# Altium footprint library MIC.PcbLib: 1 footprints
Each footprint in its own frame and in the unit in brackets; x right, y up, seen from the top. Pads: shape width x height; smd on the part's side, far side on the other; paste and mask are expansions set on the pad; w line width, h text height; cw(c..) or ccw(c..) is an arc to the next point about the centre after c.
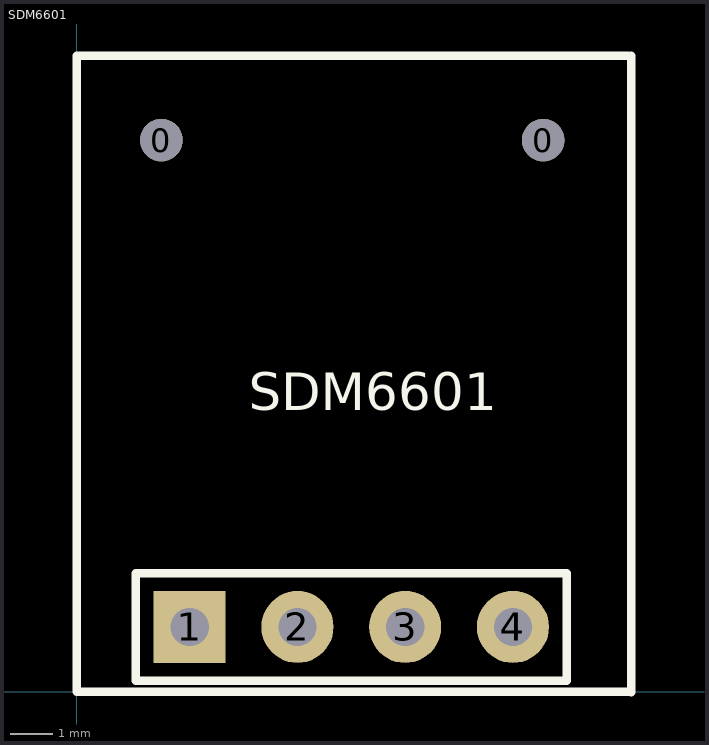
[diagram p0: the footprint, top view; thin cyan lines are the x and y axes]

## SDM6601 [mm]
pads (6):
  round 1 hole 1: 0(2,13) 0(11,13)
  rect 1.7x1.7 hole 0.9: 1(2.667,1.524)
  round 1.7 hole 0.9: 2(5.207,1.524) 3(7.747,1.524) 4(10.287,1.524)
Top Overlay:
  lines w0.2: 13,0 0,0 0,14.986 13,14.986 ; 13.081,-0.014 13.081,14.986 ; 1.397,0.254 11.557,0.254 11.557,2.794 1.397,2.794 1.397,0.254
  text "SDM6601" at 4.064,6.333 h1.52